# Altium schematic symbol library SparkFun.SCHLIB: 796 symbols (part 4 of 5) (continued)
## NDS8434 (continued)
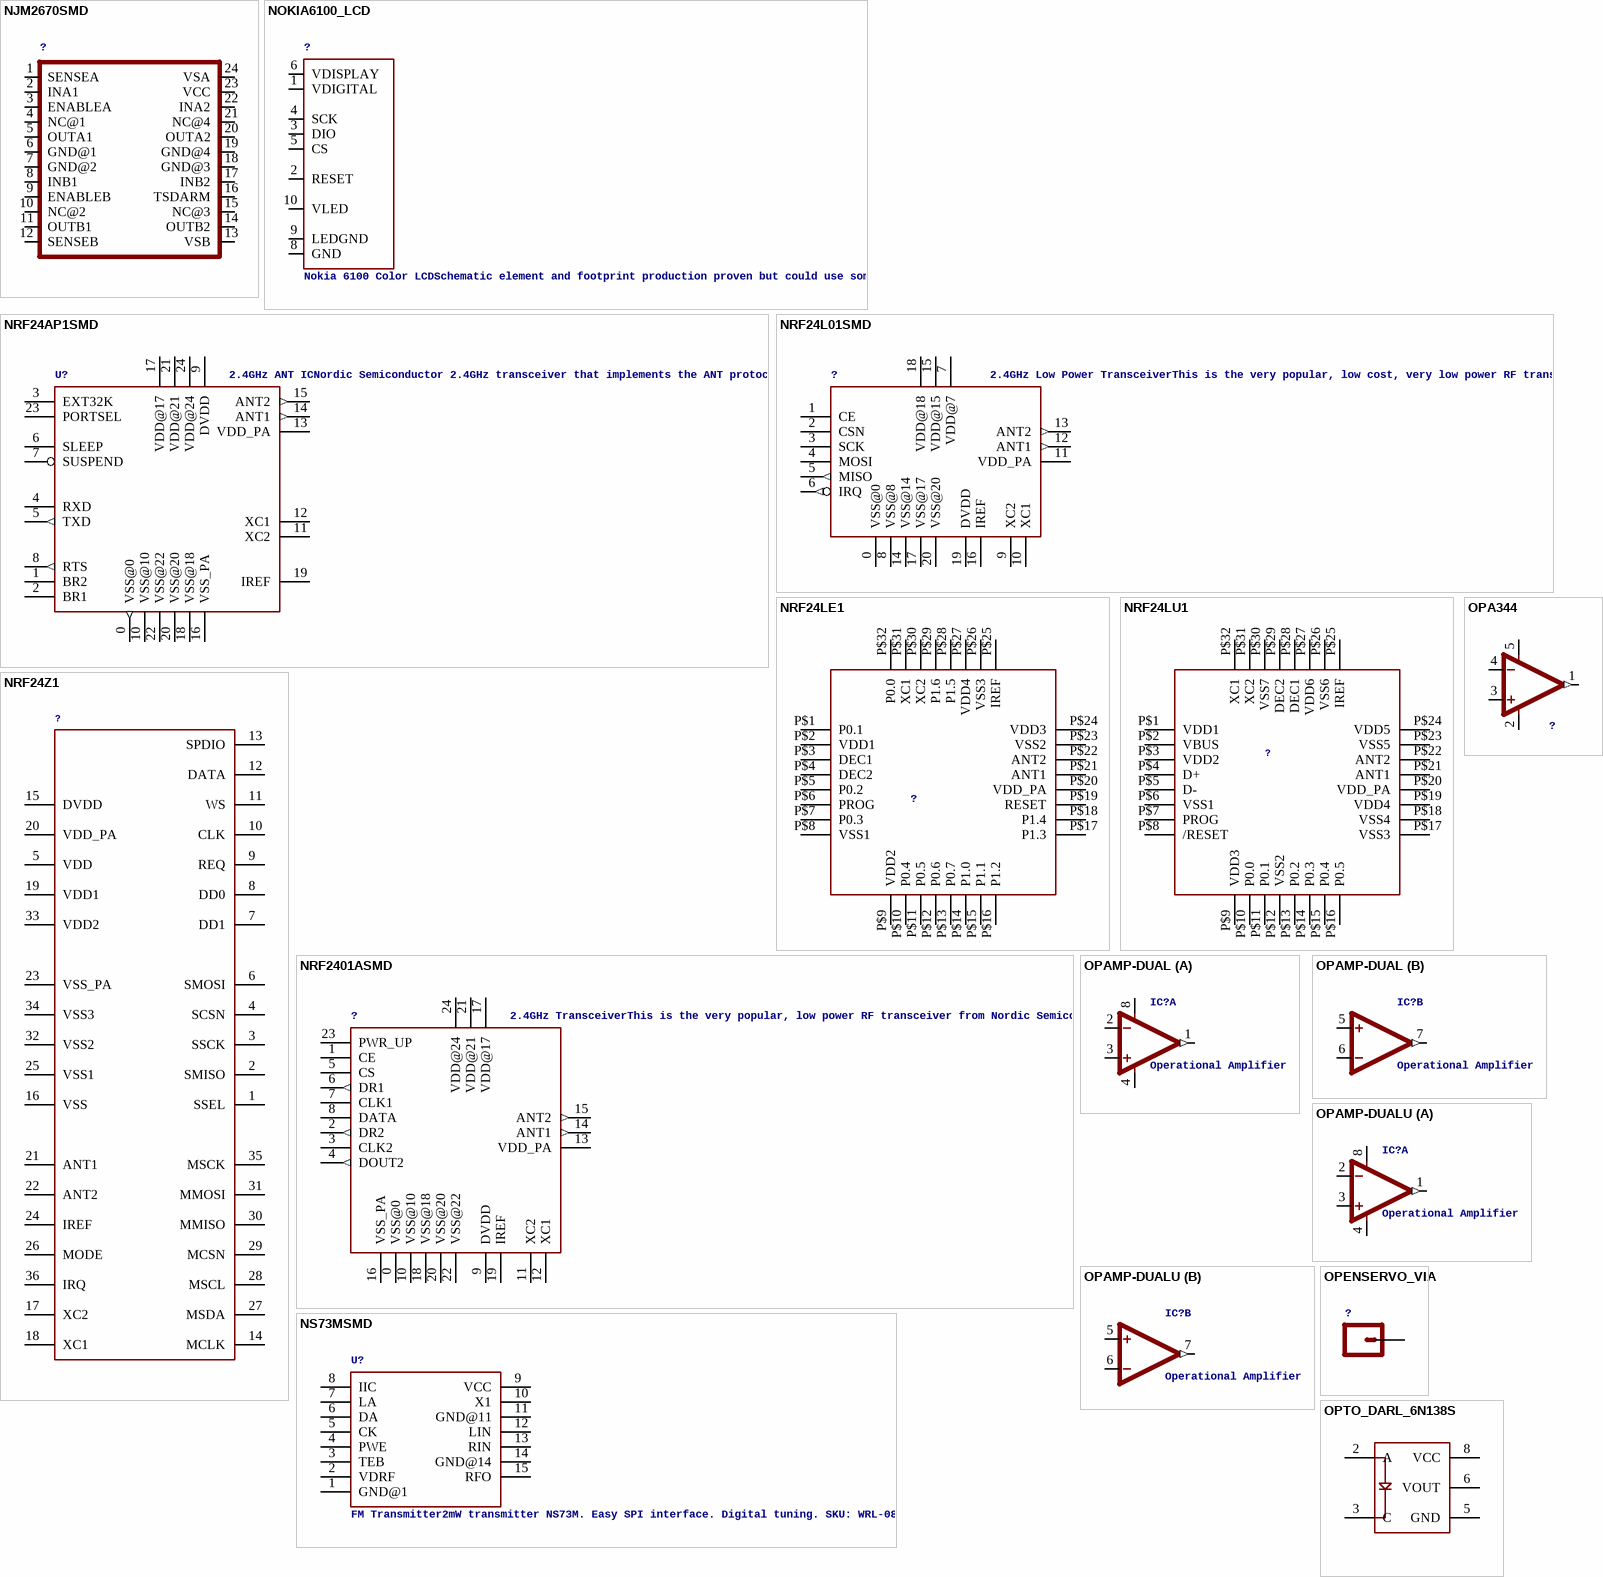
[diagram p26: symbols NJM2670SMD to OPTO_DARL_6N138S]

## NJM2670SMD
designator ?
footprint SO-24W
pins: 1 SENSEA, 2 INA1, 3 ENABLEA, 4 NC@1, 5 OUTA1 (power), 6 GND@1 (power), 7 GND@2, 8 INB1, 9 ENABLEB, 10 NC@2, 11 OUTB1, 12 SENSEB, 13 VSB, 14 OUTB2, 15 NC@3, 16 TSDARM, 17 INB2, 18 GND@3, 19 GND@4 (power), 20 OUTA2 (power), 21 NC@4, 22 INA2, 23 VCC, 24 VSA

## NOKIA6100_LCD
designator ?, comment Nokia 6100 Color LCDSchematic element and footprint production proven but could use some touching up. Spark Fun Electronics SKU : LCD-00569. Mating SMD connector : LCD-00570
footprint NOKIA6100_LCD
pins: 1 VDIGITAL, 2 RESET, 3 DIO, 4 SCK, 5 CS, 6 VDISPLAY, 8 GND, 9 LEDGND, 10 VLED

## NRF24AP1SMD
designator U?, comment 2.4GHz ANT ICNordic Semiconductor 2.4GHz transceiver that implements the ANT protocol.
footprint MLP-24
pins: 0 VSS@0 (out), 1 BR2, 2 BR1, 3 EXT32K, 4 RXD, 5 TXD (out), 6 SLEEP, 7 SUSPEND, 8 RTS (out), 9 DVDD (power), 10 VSS@10 (power), 11 XC2, 12 XC1, 13 VDD_PA (power), 14 ANT1 (out), 15 ANT2 (out), 16 VSS_PA (power), 17 VDD@17 (power), 18 VSS@18 (power), 19 IREF, 20 VSS@20 (power), 21 VDD@21 (power), 22 VSS@22 (power), 23 PORTSEL, 24 VDD@24 (power)

## NRF24L01SMD
designator ?, comment 2.4GHz Low Power TransceiverThis is the very popular, low cost, very low power RF transceiver from Nordic Semiconductor. Simple SPI interface. SKU: COM-00690
footprint QFN20
pins: 0 VSS@0 (power), 1 CE, 2 CSN, 3 SCK, 4 MOSI, 5 MISO (out), 6 IRQ (out), 7 VDD@7 (power), 8 VSS@8 (power), 9 XC2, 10 XC1, 11 VDD_PA (power), 12 ANT1 (out), 13 ANT2 (out), 14 VSS@14 (power), 15 VDD@15 (power), 16 IREF, 17 VSS@17 (power), 18 VDD@18 (power), 19 DVDD (power), 20 VSS@20 (power)

## NRF24LE1
designator ?
footprint QFN-32
pins: P$1 P0.1, P$2 VDD1, P$3 DEC1, P$4 DEC2, P$5 P0.2, P$6 PROG, P$7 P0.3, P$8 VSS1, P$9 VDD2, P$10 P0.4, P$11 P0.5, P$12 P0.6, P$13 P0.7, P$14 P1.0, P$15 P1.1, P$16 P1.2, P$17 P1.3, P$18 P1.4, P$19 RESET, P$20 VDD_PA, P$21 ANT1, P$22 ANT2, P$23 VSS2, P$24 VDD3, P$25 IREF, P$26 VSS3, P$27 VDD4, P$28 P1.5, P$29 P1.6, P$30 XC2, P$31 XC1, P$32 P0.0

## NRF24LU1
designator ?
footprint QFN-32
pins: P$1 VDD1, P$2 VBUS, P$3 VDD2, P$4 D+, P$5 D-, P$6 VSS1, P$7 PROG, P$8 /RESET, P$9 VDD3, P$10 P0.0, P$11 P0.1, P$12 VSS2, P$13 P0.2, P$14 P0.3, P$15 P0.4, P$16 P0.5, P$17 VSS3, P$18 VSS4, P$19 VDD4, P$20 VDD_PA, P$21 ANT1, P$22 ANT2, P$23 VSS5, P$24 VDD5, P$25 IREF, P$26 VSS6, P$27 VDD6, P$28 DEC1, P$29 DEC2, P$30 VSS7, P$31 XC2, P$32 XC1

## NRF24Z1
designator ?
footprint QFN-36
pins: 1 SSEL, 2 SMISO, 3 SSCK, 4 SCSN, 5 VDD, 6 SMOSI, 7 DD1, 8 DD0, 9 REQ, 10 CLK, 11 WS, 12 DATA, 13 SPDIO, 14 MCLK, 15 DVDD, 16 VSS, 17 XC2, 18 XC1, 19 VDD1, 20 VDD_PA, 21 ANT1, 22 ANT2, 23 VSS_PA, 24 IREF, 25 VSS1, 26 MODE, 27 MSDA, 28 MSCL, 29 MCSN, 30 MMISO, 31 MMOSI, 32 VSS2, 33 VDD2, 34 VSS3, 35 MSCK, 36 IRQ

## NRF2401ASMD
designator ?, comment 2.4GHz TransceiverThis is the very popular, low power RF transceiver from Nordic Semiconductor. Used in the Nike+iPod product. SKU: COM-00300
footprint MLP-24
pins: 0 VSS@0 (power), 1 CE, 2 DR2 (out), 3 CLK2, 4 DOUT2 (out), 5 CS, 6 DR1 (out), 7 CLK1, 8 DATA, 9 DVDD (power), 10 VSS@10 (power), 11 XC2, 12 XC1, 13 VDD_PA (power), 14 ANT1 (out), 15 ANT2 (out), 16 VSS_PA (power), 17 VDD@17 (power), 18 VSS@18 (power), 19 IREF, 20 VSS@20 (power), 21 VDD@21 (power), 22 VSS@22 (power), 23 PWR_UP (power), 24 VDD@24 (power)

## NS73MSMD
designator U?, comment FM Transmitter2mW transmitter NS73M. Easy SPI interface. Digital tuning. SKU: WRL-08452
footprint NS73M
pins: 1 GND@1, 2 VDRF, 3 TEB, 4 PWE, 5 CK, 6 DA, 7 LA, 8 IIC, 9 VCC, 10 X1, 11 GND@11, 12 LIN, 13 RIN, 14 GND@14, 15 RFO

## OPA344
designator ?
footprint SOT23-5
pins: 1 OUT (out), 2 V- (power), 3 +IN, 4 -IN, 5 V+ (power)

## OPAMP-DUAL
designator IC?, comment Operational Amplifier
footprint DIP08
part A pins: 1 OUT (out), 2 -IN, 3 +IN, 4 V- (power), 8 V+ (power)
part B pins: 5 +IN, 6 -IN, 7 OUT (out)

## OPAMP-DUALU
designator IC?, comment Operational Amplifier
footprint SO08
part A pins: 1 OUT (out), 2 -IN, 3 +IN, 4 V- (power), 8 V+ (power)
part B pins: 5 +IN, 6 -IN, 7 OUT (out)

## OPENSERVO_VIA
designator ?
footprint OPENSERVO_VIA
pins: P$1 1

## OPTO_DARL_6N138S
designator ?
footprint 8-SMD
pins: 2 A, 3 C, 5 GND, 6 VOUT, 8 VCC

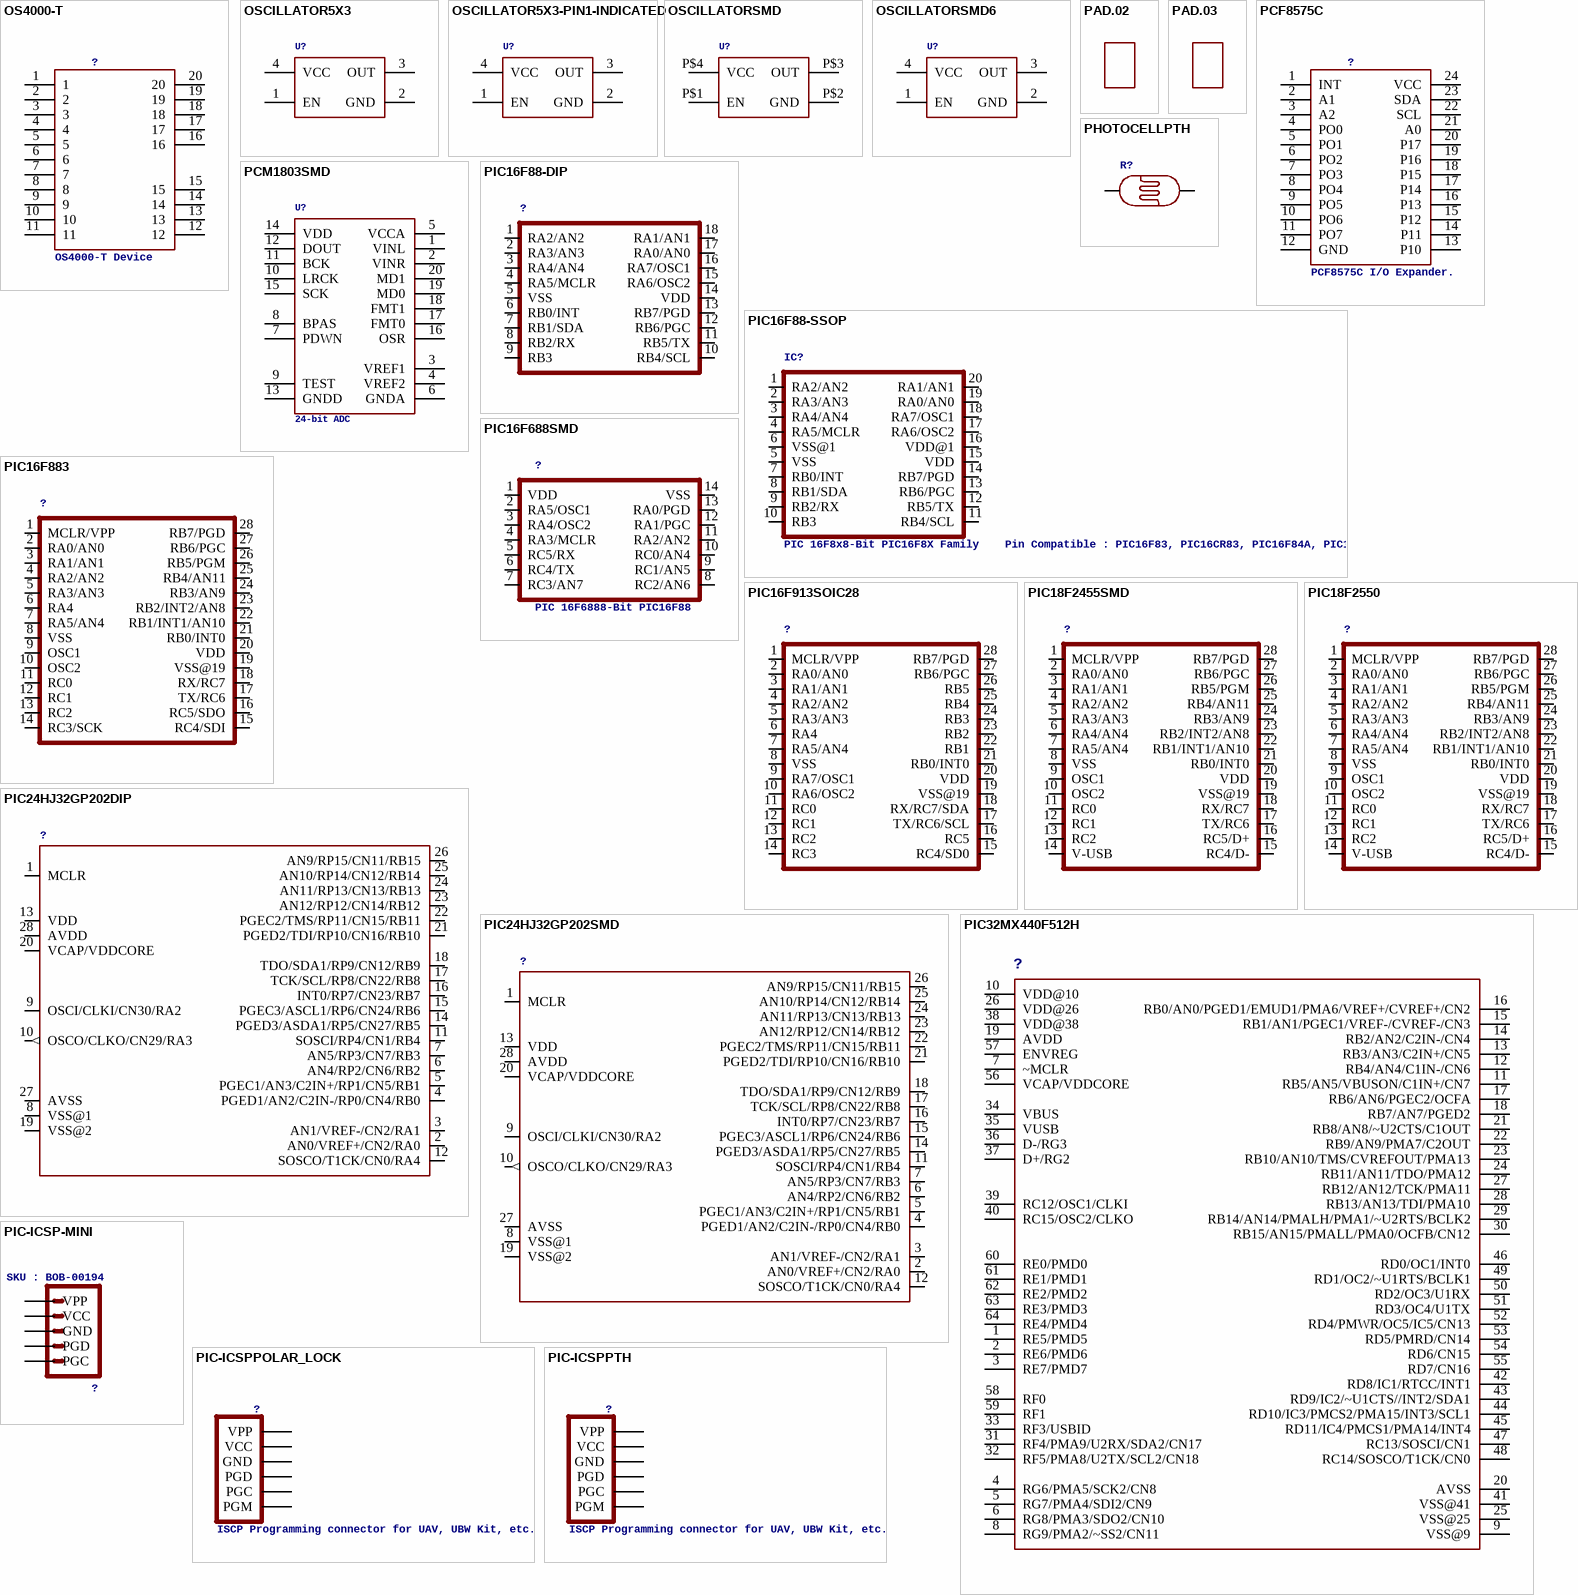
[diagram p27: symbols OS4000-T to PIC-ICSPPTH]

## OS4000-T
designator ?, comment OS4000-T Device
footprint OS4000-T
pins: 1, 2, 3, 4, 5, 6, 7, 8, 9, 10, 11, 12, 13, 14, 15, 16, 17, 18, 19, 20

## OSCILLATOR5X3
designator U?
footprint CRYSTAL-SMD-5X3
pins: 1 EN, 2 GND, 3 OUT, 4 VCC

## OSCILLATOR5X3-PIN1-INDICATED
designator U?
footprint CRYSTAL-OSC-SMD-5X3
pins: 1 EN, 2 GND, 3 OUT, 4 VCC

## OSCILLATORSMD
designator U?
footprint CRYSTAL-SMD-7X5
pins: P$1 EN, P$2 GND, P$3 OUT, P$4 VCC

## OSCILLATORSMD6
designator U?
footprint CRYSTAL-SMD-7.5X5.2-6PIN
pins: 1 EN, 2 GND, 3 OUT, 4 VCC

## PAD.02
designator ?
footprint PAD.02X.02

## PAD.03
designator ?
footprint PAD.03X.03

## PCF8575C
designator ?, comment PCF8575C I/O Expander.
footprint SO-24DW
pins: 1 INT, 2 A1, 3 A2, 4 PO0, 5 PO1, 6 PO2, 7 PO3, 8 PO4, 9 PO5, 10 PO6, 11 PO7, 12 GND, 13 P10, 14 P11, 15 P12, 16 P13, 17 P14, 18 P15, 19 P16, 20 P17, 21 A0, 22 SCL, 23 SDA, 24 VCC

## PCM1803SMD
designator U?, comment 24-bit ADC
footprint SSOP20
pins: 1 VINL, 2 VINR, 3 VREF1, 4 VREF2, 5 VCCA, 6 GNDA, 7 PDWN, 8 BPAS, 9 TEST, 10 LRCK, 11 BCK, 12 DOUT, 13 GNDD, 14 VDD, 15 SCK, 16 OSR, 17 FMT0, 18 FMT1, 19 MD0, 20 MD1

## PHOTOCELLPTH
designator R?
footprint PHOTOCELL
pins: 1 P$1, 2 P$2

## PIC16F88-DIP
designator ?
footprint DIL18
pins: 1 RA2/AN2, 2 RA3/AN3, 3 RA4/AN4, 4 RA5/MCLR, 5 VSS (power), 6 RB0/INT, 7 RB1/SDA, 8 RB2/RX, 9 RB3, 10 RB4/SCL, 11 RB5/TX, 12 RB6/PGC, 13 RB7/PGD, 14 VDD (power), 15 RA6/OSC2, 16 RA7/OSC1, 17 RA0/AN0, 18 RA1/AN1

## PIC16F88-SSOP
designator IC?, comment PIC 16F8x8-Bit PIC16F8X Family    Pin Compatible : PIC16F83, PIC16CR83, PIC16F84A, PIC16CR84
footprint SSOP20
pins: 1 RA2/AN2, 2 RA3/AN3, 3 RA4/AN4, 4 RA5/MCLR, 5 VSS (power), 6 VSS@1 (power), 7 RB0/INT, 8 RB1/SDA, 9 RB2/RX, 10 RB3, 11 RB4/SCL, 12 RB5/TX, 13 RB6/PGC, 14 RB7/PGD, 15 VDD (power), 16 VDD@1 (power), 17 RA6/OSC2, 18 RA7/OSC1, 19 RA0/AN0, 20 RA1/AN1

## PIC16F688SMD
designator ?, comment PIC 16F6888-Bit PIC16F88
footprint SOIC-14
pins: 1 VDD (power), 2 RA5/OSC1, 3 RA4/OSC2, 4 RA3/MCLR, 5 RC5/RX, 6 RC4/TX, 7 RC3/AN7, 8 RC2/AN6, 9 RC1/AN5, 10 RC0/AN4, 11 RA2/AN2, 12 RA1/PGC, 13 RA0/PGD, 14 VSS (power)

## PIC16F883
designator ?
footprint SO-28W
pins: 1 MCLR/VPP, 2 RA0/AN0, 3 RA1/AN1, 4 RA2/AN2, 5 RA3/AN3, 6 RA4, 7 RA5/AN4, 8 VSS (power), 9 OSC1, 10 OSC2, 11 RC0, 12 RC1, 13 RC2, 14 RC3/SCK, 15 RC4/SDI, 16 RC5/SDO, 17 TX/RC6, 18 RX/RC7, 19 VSS@19 (power), 20 VDD (power), 21 RB0/INT0, 22 RB1/INT1/AN10, 23 RB2/INT2/AN8, 24 RB3/AN9, 25 RB4/AN11, 26 RB5/PGM, 27 RB6/PGC, 28 RB7/PGD

## PIC16F913SOIC28
designator ?
footprint SO-28W
pins: 1 MCLR/VPP, 2 RA0/AN0, 3 RA1/AN1, 4 RA2/AN2, 5 RA3/AN3, 6 RA4, 7 RA5/AN4, 8 VSS (power), 9 RA7/OSC1, 10 RA6/OSC2, 11 RC0, 12 RC1, 13 RC2, 14 RC3, 15 RC4/SD0, 16 RC5, 17 TX/RC6/SCL, 18 RX/RC7/SDA, 19 VSS@19 (power), 20 VDD (power), 21 RB0/INT0, 22 RB1, 23 RB2, 24 RB3, 25 RB4, 26 RB5, 27 RB6/PGC, 28 RB7/PGD

## PIC18F2455SMD
designator ?
footprint SO-28W
pins: 1 MCLR/VPP, 2 RA0/AN0, 3 RA1/AN1, 4 RA2/AN2, 5 RA3/AN3, 6 RA4/AN4, 7 RA5/AN4, 8 VSS (power), 9 OSC1, 10 OSC2, 11 RC0, 12 RC1, 13 RC2, 14 V-USB, 15 RC4/D-, 16 RC5/D+, 17 TX/RC6, 18 RX/RC7, 19 VSS@19 (power), 20 VDD (power), 21 RB0/INT0, 22 RB1/INT1/AN10, 23 RB2/INT2/AN8, 24 RB3/AN9, 25 RB4/AN11, 26 RB5/PGM, 27 RB6/PGC, 28 RB7/PGD

## PIC18F2550
designator ?
footprint DIL28-3
pins: 1 MCLR/VPP, 2 RA0/AN0, 3 RA1/AN1, 4 RA2/AN2, 5 RA3/AN3, 6 RA4/AN4, 7 RA5/AN4, 8 VSS (power), 9 OSC1, 10 OSC2, 11 RC0, 12 RC1, 13 RC2, 14 V-USB, 15 RC4/D-, 16 RC5/D+, 17 TX/RC6, 18 RX/RC7, 19 VSS@19 (power), 20 VDD (power), 21 RB0/INT0, 22 RB1/INT1/AN10, 23 RB2/INT2/AN8, 24 RB3/AN9, 25 RB4/AN11, 26 RB5/PGM, 27 RB6/PGC, 28 RB7/PGD

## PIC24HJ32GP202DIP
designator ?
footprint DIL28-3
pins: 1 MCLR, 2 AN0/VREF+/CN2/RA0, 3 AN1/VREF-/CN2/RA1, 4 PGED1/AN2/C2IN-/RP0/CN4/RB0, 5 PGEC1/AN3/C2IN+/RP1/CN5/RB1, 6 AN4/RP2/CN6/RB2, 7 AN5/RP3/CN7/RB3, 8 VSS@1 (power), 9 OSCI/CLKI/CN30/RA2, 10 OSCO/CLKO/CN29/RA3 (out), 11 SOSCI/RP4/CN1/RB4, 12 SOSCO/T1CK/CN0/RA4, 13 VDD (power), 14 PGED3/ASDA1/RP5/CN27/RB5, 15 PGEC3/ASCL1/RP6/CN24/RB6, 16 INT0/RP7/CN23/RB7, 17 TCK/SCL/RP8/CN22/RB8, 18 TDO/SDA1/RP9/CN12/RB9, 19 VSS@2 (power), 20 VCAP/VDDCORE (power), 21 PGED2/TDI/RP10/CN16/RB10, 22 PGEC2/TMS/RP11/CN15/RB11, 23 AN12/RP12/CN14/RB12, 24 AN11/RP13/CN13/RB13, 25 AN10/RP14/CN12/RB14, 26 AN9/RP15/CN11/RB15, 27 AVSS (power), 28 AVDD (power)

## PIC24HJ32GP202SMD
designator ?
footprint SO-28W
pins: 1 MCLR, 2 AN0/VREF+/CN2/RA0, 3 AN1/VREF-/CN2/RA1, 4 PGED1/AN2/C2IN-/RP0/CN4/RB0, 5 PGEC1/AN3/C2IN+/RP1/CN5/RB1, 6 AN4/RP2/CN6/RB2, 7 AN5/RP3/CN7/RB3, 8 VSS@1 (power), 9 OSCI/CLKI/CN30/RA2, 10 OSCO/CLKO/CN29/RA3 (out), 11 SOSCI/RP4/CN1/RB4, 12 SOSCO/T1CK/CN0/RA4, 13 VDD (power), 14 PGED3/ASDA1/RP5/CN27/RB5, 15 PGEC3/ASCL1/RP6/CN24/RB6, 16 INT0/RP7/CN23/RB7, 17 TCK/SCL/RP8/CN22/RB8, 18 TDO/SDA1/RP9/CN12/RB9, 19 VSS@2 (power), 20 VCAP/VDDCORE (power), 21 PGED2/TDI/RP10/CN16/RB10, 22 PGEC2/TMS/RP11/CN15/RB11, 23 AN12/RP12/CN14/RB12, 24 AN11/RP13/CN13/RB13, 25 AN10/RP14/CN12/RB14, 26 AN9/RP15/CN11/RB15, 27 AVSS (power), 28 AVDD (power)

## PIC32MX440F512H
designator ?
footprint SQFP-S-10X10-64
pins: 1 RE5/PMD5, 2 RE6/PMD6, 3 RE7/PMD7, 4 RG6/PMA5/SCK2/CN8, 5 RG7/PMA4/SDI2/CN9, 6 RG8/PMA3/SDO2/CN10, 7 ~MCLR, 8 RG9/PMA2/~SS2/CN11, 9 VSS@9, 10 VDD@10, 11 RB5/AN5/VBUSON/C1IN+/CN7, 12 RB4/AN4/C1IN-/CN6, 13 RB3/AN3/C2IN+/CN5, 14 RB2/AN2/C2IN-/CN4, 15 RB1/AN1/PGEC1/VREF-/CVREF-/CN3, 16 RB0/AN0/PGED1/EMUD1/PMA6/VREF+/CVREF+/CN2, 17 RB6/AN6/PGEC2/OCFA, 18 RB7/AN7/PGED2, 19 AVDD, 20 AVSS, 21 RB8/AN8/~U2CTS/C1OUT, 22 RB9/AN9/PMA7/C2OUT, 23 RB10/AN10/TMS/CVREFOUT/PMA13, 24 RB11/AN11/TDO/PMA12, 25 VSS@25, 26 VDD@26, 27 RB12/AN12/TCK/PMA11, 28 RB13/AN13/TDI/PMA10, 29 RB14/AN14/PMALH/PMA1/~U2RTS/BCLK2, 30 RB15/AN15/PMALL/PMA0/OCFB/CN12, 31 RF4/PMA9/U2RX/SDA2/CN17, 32 RF5/PMA8/U2TX/SCL2/CN18, 33 RF3/USBID, 34 VBUS, 35 VUSB, 36 D-/RG3, 37 D+/RG2, 38 VDD@38, 39 RC12/OSC1/CLKI, 40 RC15/OSC2/CLKO, 41 VSS@41, 42 RD8/IC1/RTCC/INT1, 43 RD9/IC2/~U1CTS//INT2/SDA1, 44 RD10/IC3/PMCS2/PMA15/INT3/SCL1, 45 RD11/IC4/PMCS1/PMA14/INT4, 46 RD0/OC1/INT0, 47 RC13/SOSCI/CN1, 48 RC14/SOSCO/T1CK/CN0, 49 RD1/OC2/~U1RTS/BCLK1, 50 RD2/OC3/U1RX, 51 RD3/OC4/U1TX, 52 RD4/PMWR/OC5/IC5/CN13, 53 RD5/PMRD/CN14, 54 RD6/CN15, 55 RD7/CN16, 56 VCAP/VDDCORE, 57 ENVREG, 58 RF0, 59 RF1, 60 RE0/PMD0, 61 RE1/PMD1, 62 RE2/PMD2, 63 RE3/PMD3, 64 RE4/PMD4

## PIC-ICSP-MINI
designator ?, comment PIC-ICSP-MiniMiniature 5-pin connection for temporary programming of PICs. Use this device in your design to save space. Program the PIC with this adapter Spark Fun Electronics SKU : BOB-00194
footprint PIC-ICSP-MINI
pins: 1 VPP, 2 VCC, 3 GND, 4 PGD, 5 PGC

## PIC-ICSPPOLAR_LOCK
designator ?, comment ISCP Programming connector for UAV, UBW Kit, etc.
footprint MOLEX-1X6_LOCK
pins: 1 PGM, 2 PGC, 3 PGD, 4 GND, 5 VCC, 6 VPP

## PIC-ICSPPTH
designator ?, comment ISCP Programming connector for UAV, UBW Kit, etc.
footprint MOLEX-1X6
pins: 1 PGM, 2 PGC, 3 PGD, 4 GND, 5 VCC, 6 VPP

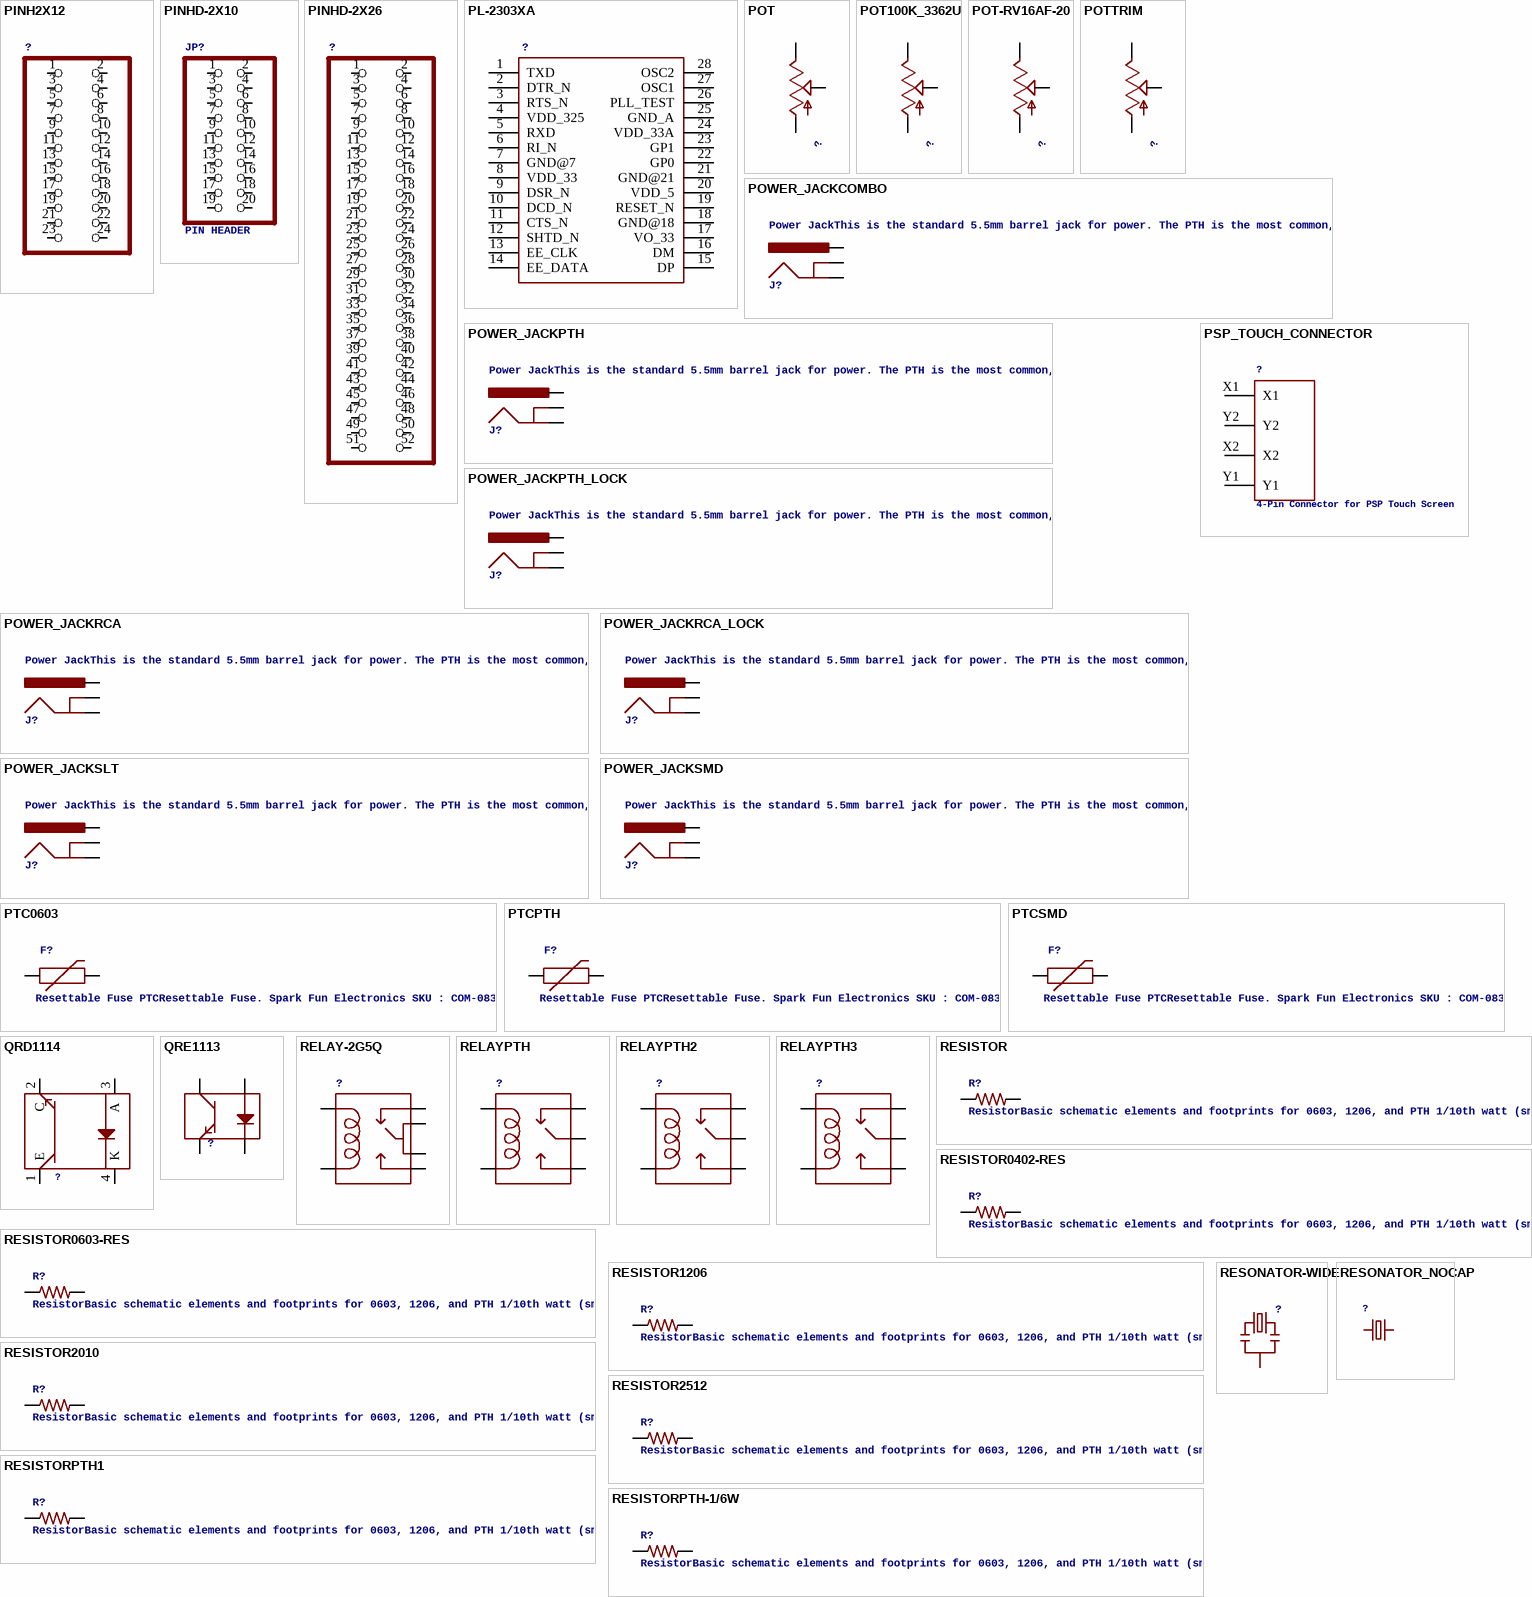
[diagram p28: symbols PINH2X12 to RESONATOR_NOCAP]

## PINH2X12
designator ?
footprint 2X12
pins: 1, 2, 3, 4, 5, 6, 7, 8, 9, 10, 11, 12, 13, 14, 15, 16, 17, 18, 19, 20, 21, 22, 23, 24

## PINHD-2X10
designator JP?, comment PIN HEADER
footprint 2X10
pins: 1, 2, 3, 4, 5, 6, 7, 8, 9, 10, 11, 12, 13, 14, 15, 16, 17, 18, 19, 20

## PINHD-2X26
designator ?
footprint 2X26
pins: 1, 2, 3, 4, 5, 6, 7, 8, 9, 10, 11, 12, 13, 14, 15, 16, 17, 18, 19, 20, 21, 22, 23, 24, 25, 26, 27, 28, 29, 30, 31, 32, 33, 34, 35, 36, 37, 38, 39, 40, 41, 42, 43, 44, 45, 46, 47, 48, 49, 50, 51, 52

## PL-2303XA
designator ?, comment Prolific USB chip, requires 12MHz xtal  (value not drawn)
footprint SSOP28DB
pins: 1 TXD, 2 DTR_N, 3 RTS_N, 4 VDD_325, 5 RXD, 6 RI_N, 7 GND@7, 8 VDD_33, 9 DSR_N, 10 DCD_N, 11 CTS_N, 12 SHTD_N, 13 EE_CLK, 14 EE_DATA, 15 DP, 16 DM, 17 VO_33, 18 GND@18, 19 RESET_N, 20 VDD_5, 21 GND@21, 22 GP0, 23 GP1, 24 VDD_33A, 25 GND_A, 26 PLL_TEST, 27 OSC1, 28 OSC2

## POT
designator ?
footprint ALPS_POT
pins: P$1 E, P$2 S, P$3 A

## POT100K_3362U
designator ?
footprint 3362U
pins: P$1 E, P$2 S, P$3 A

## POT-RV16AF-20
designator ?
footprint POT_ALPHA_RV16AF-20
pins: 1 A, 2 S, 3 E

## POTTRIM
designator ?
footprint TRIM_POT
pins: 1 S, 2 E, 3 A

## POWER_JACKCOMBO
designator J?, comment Power JackThis is the standard 5.5mm barrel jack for power. The PTH is the most common, proven, reliable, footprint. All others are experimental. The Slot footprint only works if the mill layer is transmitted to the PCB fab house so be warned. Spark Fun Electronics SKU : PRT-00119. Mating wall wart : TOL-00298 (and others)
footprint POWER_JACK_COMBO
pins: GND GNDBREAK, GND@1 GND, POWER PWR

## POWER_JACKPTH
designator J?, comment Power JackThis is the standard 5.5mm barrel jack for power. The PTH is the most common, proven, reliable, footprint. All others are experimental. The Slot footprint only works if the mill layer is transmitted to the PCB fab house so be warned. Spark Fun Electronics SKU : PRT-00119. Mating wall wart : TOL-00298 (and others)
footprint POWER_JACK_PTH
pins: GND, GNDBREAK, PWR

## POWER_JACKPTH_LOCK
designator J?, comment Power JackThis is the standard 5.5mm barrel jack for power. The PTH is the most common, proven, reliable, footprint. All others are experimental. The Slot footprint only works if the mill layer is transmitted to the PCB fab house so be warned. Spark Fun Electronics SKU : PRT-00119. Mating wall wart : TOL-00298 (and others)
footprint POWER_JACK_PTH_LOCK
pins: GND, GNDBREAK, PWR

## POWER_JACKRCA
designator J?, comment Power JackThis is the standard 5.5mm barrel jack for power. The PTH is the most common, proven, reliable, footprint. All others are experimental. The Slot footprint only works if the mill layer is transmitted to the PCB fab house so be warned. Spark Fun Electronics SKU : PRT-00119. Mating wall wart : TOL-00298 (and others)
footprint RCA
pins: BARREL GND, BREAK PWR, SPRING GNDBREAK

## POWER_JACKRCA_LOCK
designator J?, comment Power JackThis is the standard 5.5mm barrel jack for power. The PTH is the most common, proven, reliable, footprint. All others are experimental. The Slot footprint only works if the mill layer is transmitted to the PCB fab house so be warned. Spark Fun Electronics SKU : PRT-00119. Mating wall wart : TOL-00298 (and others)
footprint RCA_LOCK
pins: BARREL GND, BREAK PWR, SPRING GNDBREAK

## POWER_JACKSLT
designator J?, comment Power JackThis is the standard 5.5mm barrel jack for power. The PTH is the most common, proven, reliable, footprint. All others are experimental. The Slot footprint only works if the mill layer is transmitted to the PCB fab house so be warned. Spark Fun Electronics SKU : PRT-00119. Mating wall wart : TOL-00298 (and others)
footprint POWER_JACK_SLOT
pins: GND@1 GNDBREAK, GND@2 GND, PWR

## POWER_JACKSMD
designator J?, comment Power JackThis is the standard 5.5mm barrel jack for power. The PTH is the most common, proven, reliable, footprint. All others are experimental. The Slot footprint only works if the mill layer is transmitted to the PCB fab house so be warned. Spark Fun Electronics SKU : PRT-00119. Mating wall wart : TOL-00298 (and others)
footprint POWER_JACK_SMD
pins: GND GNDBREAK, P$4 GND, VIN0 PWR

## PSP_TOUCH_CONNECTOR
designator ?, comment 4-Pin Connector for PSP Touch Screen
footprint PSP_TOUCH_CONNECTOR
pins: X1, X2, Y1, Y2

## PTC0603
designator F?, comment Resettable Fuse PTCResettable Fuse. Spark Fun Electronics SKU : COM-08357
footprint 0603
pins: 1, 2

## PTCPTH
designator F?, comment Resettable Fuse PTCResettable Fuse. Spark Fun Electronics SKU : COM-08357
footprint PTC
pins: P$1 1, P$2 2

## PTCSMD
designator F?, comment Resettable Fuse PTCResettable Fuse. Spark Fun Electronics SKU : COM-08357
footprint PTC-1206
pins: 1, 2

## QRD1114
designator ?
footprint QRD1114
pins: 1 E, 2 C, 3 A, 4 K

## QRE1113
designator ?
footprint QRE1113
pins: 1 A, 2 K, 3 C, 4 E

## RELAY-2G5Q
designator ?
footprint RELAY-G5V
pins: 1, 2, 5, 6, 9, 10

## RELAYPTH
designator ?
footprint RELAY-G5Q
pins: 1 COIL2, 2 MAIN, 3 NO, 4 NC, 5 COIL1

## RELAYPTH2
designator ?
footprint RELAY-T9A
pins: COIL1, COIL2, MAIN, NC, NO

## RELAYPTH3
designator ?
footprint RELAY-T9A-2
pins: COIL1, COIL2, MAIN, NC, NO
